# Altium footprint library AD常用3D封装.PCBLIB: 342 footprints (part 19 of 22)
Each footprint in its own frame and in the unit in brackets; x right, y up, seen from the top. Pads: shape width x height; smd on the part's side, far side on the other; paste and mask are expansions set on the pad; w line width, h text height; cw(c..) or ccw(c..) is an arc to the next point about the centre after c.
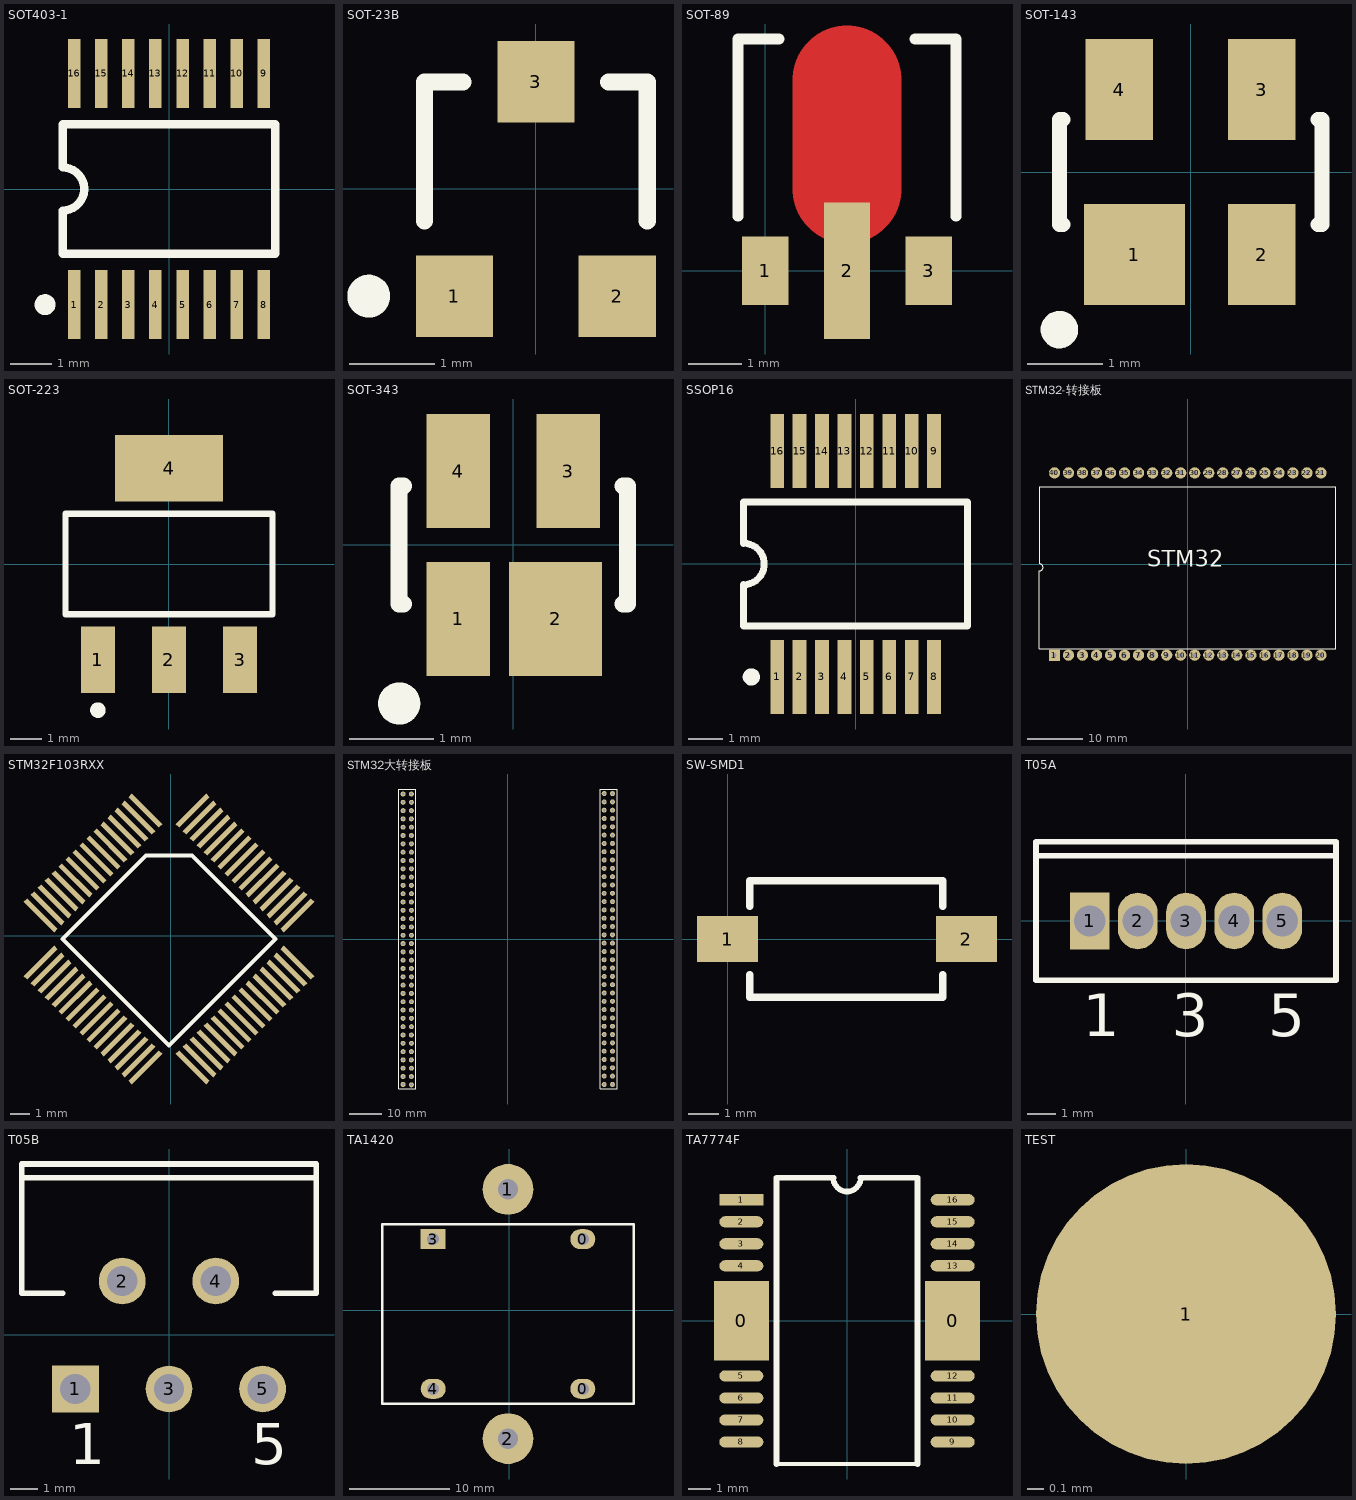
[diagram p18: the footprints below, top view; thin cyan lines are the x and y axes]

## SOT403-1 [mm] "Shrink Small Outline; 16 Leads; Body Width 4.4 mm; Pitch 0.65 mm"
height 1.1
pads (16):
  rect 0.3x1.65 smd: 1(-2.275,-2.775) 2(-1.625,-2.775) 3(-0.975,-2.775) 4(-0.325,-2.775) 5(0.325,-2.775) 6(0.975,-2.775) 7(1.625,-2.775) 8(2.275,-2.775) 9(2.275,2.775) 10(1.625,2.775) 11(0.975,2.775) 12(0.325,2.775) 13(-0.325,2.775) 14(-0.975,2.775) 15(-1.625,2.775) 16(-2.275,2.775)
TopOverlay:
  circle w0.25: c-2.975,-2.775 r0.125
  lines w0.2: -2.55,-1.55 -2.55,-0.517 ccw(c-2.55,0) -2.55,0.517 -2.55,1.55 2.55,1.55 2.55,-1.55 -2.55,-1.55

## SOT-23B [mm] "SOT-23; 3 Leads; Body 3.0 x 2.6 mm, inc. leads (LxW max)"
height 1.1
pads (3):
  rect 0.9x0.95 smd: 1(-0.95,-1.25) 2(0.95,-1.25) 3(0,1.25)
TopOverlay:
  circle w0.25: c-1.95,-1.25 r0.125
  lines w0.2: -1.3,-0.375 -1.3,1.25 -0.85,1.25 ; 0.85,1.25 1.3,1.25 1.3,-0.375

## SOT-89 [mil]
pads (3):
  rect 34x50 smd: 1(0,0) 3(120,0)
  rect 34x100 smd: 2(60,0)
TopLayer:
  lines w80: 60,60 60,140
TopOverlay:
  lines w8: -20,40 -20,170 10,170 ; 110,170 140,170 140,40
3D body: height 55.12, standoff 0, extent -28.58,-5.01 148.59,149.9

## SOT-143 [mm] "SOT-143; 4 Leads; Body 3 x 2.6 mm, inc. leads (LxW max)"
height 1.2
pads (4):
  rect 1.35x1.35 smd: 1(-0.75,-1.1)
  rect 0.9x1.35 smd: 2(0.95,-1.1) 3(0.95,1.1) 4(-0.95,1.1)
TopOverlay:
  circle w0.25: c-1.75,-2.1 r0.125
  lines w0.2: -1.7,-0.7 -1.75,-0.7 -1.75,0.7 -1.7,0.7 ; 1.7,-0.7 1.75,-0.7 1.75,0.7 1.7,0.7
3D body: height 1, standoff 0, extent -1.485,-1.21 1.435,1.21

## SOT-223 [mm] "SOT-223/SC-73; 4 Leads; Body 6.7 x 7.3 mm, inc. leads (LxW max)"
height 1.78
pads (4):
  rect 1.1x2.15 smd: 1(-2.3,-3.1) 2(0,-3.1) 3(2.3,-3.1)
  rect 3.5x2.15 smd: 4(0,3.1)
TopOverlay:
  circle w0.25: c-2.3,-4.725 r0.125
  lines w0.2: -3.35,-1.625 3.35,-1.625 3.35,1.625 -3.35,1.625 -3.35,-1.625
3D body: height 1.65, standoff -0.03, extent -3.251,-3.58 3.249,3.38

## SOT-343 [mm] "SOT-343; 4 Leads; Body 2.2 x 2.2 mm, inc. leads (LxW max)"
height 1
pads (4):
  rect 0.75x1.35 smd: 1(-0.65,-0.875) 3(0.65,0.875) 4(-0.65,0.875)
  rect 1.1x1.35 smd: 2(0.5,-0.875)
TopOverlay:
  circle w0.25: c-1.35,-1.875 r0.125
  lines w0.2: -1.3,-0.7 -1.35,-0.7 -1.35,0.7 -1.3,0.7 ; 1.3,-0.7 1.35,-0.7 1.35,0.7 1.3,0.7
3D body: height 1, standoff 0, extent -1.1,-1.1 1.1,1.1

## SSOP16 [mm] "SSOP; 16 Leads; Body Width 5.3 mm; Pitch 0.65 mm"
height 2
pads (16):
  rect 0.4x2.15 smd: 1(-2.275,-3.275) 2(-1.625,-3.275) 3(-0.975,-3.275) 4(-0.325,-3.275) 5(0.325,-3.275) 6(0.975,-3.275) 7(1.625,-3.275) 8(2.275,-3.275) 9(2.275,3.275) 10(1.625,3.275) 11(0.975,3.275) 12(0.325,3.275) 13(-0.325,3.275) 14(-0.975,3.275) 15(-1.625,3.275) 16(-2.275,3.275)
TopOverlay:
  circle w0.25: c-3.025,-3.275 r0.125
  lines w0.2: -3.25,-1.8 3.25,-1.8 3.25,1.8 -3.25,1.8 -3.25,0.6 cw(c-3.25,0) -3.25,-0.6 -3.25,-1.8
3D body: height 1.99, standoff 0.01, extent -3.162,-3.95 3.162,3.95

## STM32-转接板 [mil]
pads (40):
  rect 80x80 hole 30: 1(-950,-650)
  round 80 hole 30: 2(-850,-650) 3(-750,-650) 4(-650,-650) 5(-550,-650) 6(-450,-650) 7(-350,-650) 8(-250,-650) 9(-150,-650) 10(-50,-650) 11(50,-650) 12(150,-650) 13(250,-650) 14(350,-650) 15(450,-650) 16(550,-650) 17(650,-650) 18(750,-650) 19(850,-650) 20(950,-650) 21(950,650) 22(850,650) 23(750,650) 24(650,650) 25(550,650) 26(450,650) 27(350,650) 28(250,650) 29(150,650) 30(50,650) 31(-50,650) 32(-150,650) 33(-250,650) 34(-350,650) 35(-450,650) 36(-550,650) 37(-650,650) 38(-750,650) 39(-850,650) 40(-950,650)
TopOverlay:
  lines w7.87: -1057.09,-49.21 -1057.09,-603.94 1057.09,-603.94 1057.09,550.79 -1057.09,550.79 ; -1056.69,-49.21 ccw(c-1056.69,-24.21) -1056.69,0.79 -1056.69,550.79
  text "STM32" at -290,-60 h200

## STM32F103RXX [mil]
pads (64):
  rect 10x86.61 smd rot 45: 1(-51,250) 2(-64.92,236.08) 3(-78.84,222.16) 4(-92.76,208.24) 5(-106.68,194.32) 6(-120.6,180.4) 7(-134.52,166.48) 8(-148.44,152.56) 9(-162.36,138.64) 10(-176.27,124.73) 11(-190.19,110.81) 12(-204.11,96.89) 13(-218.03,82.97) 14(-231.95,69.05) 15(-245.87,55.13) 16(-259.79,41.21) 33(43.65,-262.23) 34(57.57,-248.32) 35(71.49,-234.4) 36(85.41,-220.48) 37(99.33,-206.56) 38(113.25,-192.64) 39(127.17,-178.72) 40(141.09,-164.8) 41(155.01,-150.88) 42(168.93,-136.96) 43(182.85,-123.04) 44(196.77,-109.12) 45(210.69,-95.2) 46(224.6,-81.28) 47(238.52,-67.36) 48(252.44,-53.44)
  rect 10x86.61 smd rot 135: 17(-259.79,-53.44) 18(-245.87,-67.36) 19(-231.95,-81.28) 20(-218.03,-95.2) 21(-204.11,-109.12) 22(-190.19,-123.04) 23(-176.27,-136.96) 24(-162.36,-150.88) 25(-148.44,-164.8) 26(-134.52,-178.72) 27(-120.6,-192.64) 28(-106.68,-206.56) 29(-92.76,-220.48) 30(-78.84,-234.4) 31(-64.92,-248.32) 32(-51,-262.23) 49(252.44,41.21) 50(238.52,55.13) 51(224.6,69.05) 52(210.69,82.97) 53(196.77,96.89) 54(182.85,110.81) 55(168.93,124.73) 56(155.01,138.64) 57(141.09,152.56) 58(127.17,166.48) 59(113.25,180.4) 60(99.33,194.32) 61(85.41,208.24) 62(71.49,222.16) 63(57.57,236.08) 64(43.65,250)
TopOverlay:
  lines w7.87: -216.08,-6.12 -49.19,160.78 41.84,160.78 208.74,-6.12 -3.67,-218.53 -216.08,-6.12
3D body: height 59.06, standoff 0.79, extent -338.07,-340.06 330.07,328.07

## STM32大转接板 [mil]
pads (144):
  round 60 hole 30: 1(-1260,1747.5) 2(-1160,1747.5) 3(-1260,1647.5) 4(-1160,1647.5) 5(-1260,1547.5) 6(-1160,1547.5) 7(-1260,1447.5) 8(-1160,1447.5) 9(-1260,1347.5) 10(-1160,1347.5) 11(-1260,1247.5) 12(-1160,1247.5) 13(-1260,1147.5) 14(-1160,1147.5) 15(-1260,1047.5) 16(-1160,1047.5) 17(-1260,947.5) 18(-1160,947.5) 19(-1260,847.5) 20(-1160,847.5) 21(-1260,747.5) 22(-1160,747.5) 23(-1260,647.5) 24(-1160,647.5) 25(-1260,547.5) 26(-1160,547.5) 27(-1260,447.5) 28(-1160,447.5) 29(-1260,347.5) 30(-1160,347.5) 31(-1260,247.5) 32(-1160,247.5) 33(-1260,147.5) 34(-1160,147.5) 35(-1260,47.5) 36(-1160,47.5) 37(-1260,-52.5) 38(-1160,-52.5) 39(-1260,-152.5) 40(-1160,-152.5) 41(-1260,-252.5) 42(-1160,-252.5) 43(-1260,-352.5) 44(-1160,-352.5) 45(-1260,-452.5) 46(-1160,-452.5) 47(-1260,-552.5) 48(-1160,-552.5) 49(-1260,-652.5) 50(-1160,-652.5) 51(-1260,-752.5) 52(-1160,-752.5) 53(-1260,-852.5) 54(-1160,-852.5) 55(-1260,-952.5) 56(-1160,-952.5) 57(-1260,-1052.5) 58(-1160,-1052.5) 59(-1260,-1152.5) 60(-1160,-1152.5) 61(-1260,-1252.5) 62(-1160,-1252.5) 63(-1260,-1352.5) 64(-1160,-1352.5) 65(-1260,-1452.5) 66(-1160,-1452.5) 67(-1260,-1552.5) 68(-1160,-1552.5) 69(-1260,-1652.5) 70(-1160,-1652.5) 71(-1260,-1747.5) 72(-1160,-1752.5) 73(1160,1752.5) 74(1260,1752.5) 75(1160,1652.5) 76(1260,1652.5) 77(1160,1552.5) 78(1260,1552.5) 79(1160,1452.5) 80(1260,1452.5) 81(1160,1352.5) 82(1260,1352.5) 83(1160,1252.5) 84(1260,1252.5) 85(1160,1152.5) 86(1260,1152.5) 87(1160,1052.5) 88(1260,1052.5) 89(1160,952.5) 90(1260,952.5) 91(1160,852.5) 92(1260,852.5) 93(1160,752.5) 94(1260,752.5) 95(1160,652.5) 96(1260,652.5) 97(1160,552.5) 98(1260,552.5) 99(1160,452.5) 100(1260,452.5) 101(1160,352.5) 102(1260,352.5) 103(1160,252.5) 104(1260,252.5) 105(1160,152.5) 106(1260,152.5) 107(1160,52.5) 108(1260,52.5) 109(1160,-47.5) 110(1260,-47.5) 111(1160,-147.5) 112(1260,-147.5) 113(1160,-247.5) 114(1260,-247.5) 115(1160,-347.5) 116(1260,-347.5) 117(1160,-447.5) 118(1260,-447.5) 119(1160,-547.5) 120(1260,-547.5) 121(1160,-647.5) 122(1260,-647.5) 123(1160,-747.5) 124(1260,-747.5) 125(1160,-847.5) 126(1260,-847.5) 127(1160,-947.5) 128(1260,-947.5) 129(1160,-1047.5) 130(1260,-1047.5) 131(1160,-1147.5) 132(1260,-1147.5) 133(1160,-1247.5) 134(1260,-1247.5) 135(1160,-1347.5) 136(1260,-1347.5) 137(1160,-1447.5) 138(1260,-1447.5) 139(1160,-1547.5) 140(1260,-1547.5) 141(1160,-1647.5) 142(1260,-1647.5) 143(1160,-1747.5) 144(1260,-1747.5)
TopOverlay:
  lines w10: -1310,-1802.5 -1105,-1802.5 -1105,1802.5 -1310,1802.5 -1310,-1802.5 ; 1110,-1797.5 1110,1807.5 1315,1807.5 1315,-1797.5 1110,-1797.5

## SW-SMD1 [mm]
pads (2):
  rect 2x1.5 smd: 1(0,0) 2(7.8,0)
TopOverlay:
  lines w0.254: 0.725,-1.168 0.725,-1.9 7.025,-1.9 7.025,-1.168 ; 0.725,1.067 0.725,1.9 7.025,1.9 7.025,1.067
3D body: height 2.5, standoff 0, extent -0.059,-1.945 7.831,1.905

## T05A [mm] "TO, Thru-Hole, Vertical, Heatsink Mounted; 5 In-Line Leads; Pitch 1.70 mm"
height 15.9
pads (5):
  rect 1.4x2 hole 1.1: 1(-3.4,0)
  oval 1.4x2 hole 1.1: 2(-1.7,0) 3(0,0) 4(1.7,0) 5(3.4,0)
TopOverlay:
  lines w0.2: -5.3,2.3 5.3,2.3 ; -5.3,-2.1 -5.3,2.8 5.3,2.8 5.3,-2.1 -5.3,-2.1
  text "5" at 2.9,-4.075 h1.5
  text "3" at -0.5,-4.075 h1.5
  text "1" at -3.65,-4.075 h1.5

## T05B [mm] "TO, Thru-Hole, Vertical, Heatsink Mounted; 5 Bent Staggered Leads; Pitch 1.7 mm"
height 21.1
pads (5):
  rect 1.7x1.7 hole 1.1: 1(-3.4,-1.96)
  round 1.7 hole 1.1: 2(-1.7,1.96) 3(0,-1.96) 4(1.7,1.96) 5(3.4,-1.96)
TopOverlay:
  lines w0.2: -5.35,5.71 5.35,5.71 ; -3.854,1.51 -5.35,1.51 -5.35,6.21 5.35,6.21 5.35,1.51 3.854,1.51
  text "1" at -3.62,-4.685 h1.5
  text "5" at 2.98,-4.685 h1.5

## TA1420 [mm]
pads (6):
  oval 2.5x2 hole 1.2: 0(7.38,-7.888) 0(7.38,7.112) 4(-7.62,-7.888)
  round 5.08 hole 2.032: 1(-0.12,12.112) 2(-0.12,-12.888)
  rect 2.5x2 hole 1.2: 3(-7.62,7.112)
TopOverlay:
  lines w0.254: -1.92,8.612 12.48,8.612 12.48,-9.388 -12.72,-9.388 -12.72,8.612 -0.22,8.612

## TA7774F [mm]
pads (18):
  rect 2.5x3.6 smd: 0(-4.8,0) 0(4.8,0)
  rect 2x0.508 smd: 1(-4.8,5.5)
  oval 2x0.508 smd: 2(-4.8,4.5) 3(-4.8,3.5) 4(-4.8,2.5) 5(-4.8,-2.5) 6(-4.8,-3.5) 7(-4.8,-4.5) 8(-4.8,-5.5) 9(4.8,-5.5) 10(4.8,-4.5) 11(4.8,-3.5) 12(4.8,-2.5) 13(4.8,2.5) 14(4.8,3.5) 15(4.8,4.5) 16(4.8,5.5)
TopOverlay:
  lines w0.2: -3.2,-6.5 3.2,-6.5
  lines w0.254: -3.2,-6.5 -3.2,6.5 -0.6,6.5 ; -0.625,6.5 ccw(c0,6.5) 0.625,6.5 ; 0.6,6.5 3.2,6.5 3.2,-6.5

## TEST [mil]
pads (1):
  round 70 smd: 1(0,0)